# Altium footprint library ST封装.PcbLib: 1336 footprints (part 31 of 109) (continued)
## BGA150P31X31-961 [mm] "BGA, 961-Leads, Body 47.5x47.5mm, Pitch 1.5mm" (continued)
Top Overlay:
  circle w0.25: c-24.4,22.5 r0.125
  region: -22.75,23.75 -23.75,22.75 -23.75,23.75
  lines w0.2: -23.75,22.75 -22.75,23.75 ; -23.75,-23.75 23.75,-23.75 23.75,23.75 -23.75,23.75 -23.75,-23.75
Mechanical 13:
  lines w0.1: -23.75,-23.75 23.75,-23.75 23.75,23.75 -23.75,23.75 -23.75,-23.75
Mechanical 15:
  lines w0.1: -0.5,0 0.5,0 ; 0,-0.5 0,0.5 ; -24.75,-24.75 24.75,-24.75 24.75,24.75 -24.75,24.75 -24.75,-24.75
3D body: height 3.5, standoff 0, extent -23.75,-23.75 23.75,23.75

## BGA150P32X32-1024 [mm] "BGA, 1024-Leads, Body 50x50mm, Pitch 1.5mm"
height 3.5
pads (1024):
  round 0.6 smd: A1(-23.25,23.25) A2(-21.75,23.25) A3(-20.25,23.25) A4(-18.75,23.25) A5(-17.25,23.25) A6(-15.75,23.25) A7(-14.25,23.25) A8(-12.75,23.25) A9(-11.25,23.25) A10(-9.75,23.25) A11(-8.25,23.25) A12(-6.75,23.25) A13(-5.25,23.25) A14(-3.75,23.25) A15(-2.25,23.25) A16(-0.75,23.25) A17(0.75,23.25) A18(2.25,23.25) A19(3.75,23.25) A20(5.25,23.25) A21(6.75,23.25) A22(8.25,23.25) A23(9.75,23.25) A24(11.25,23.25) A25(12.75,23.25) A26(14.25,23.25) A27(15.75,23.25) A28(17.25,23.25) A29(18.75,23.25) A30(20.25,23.25) A31(21.75,23.25) A32(23.25,23.25) AA1(-23.25,-6.75) AA2(-21.75,-6.75) AA3(-20.25,-6.75) AA4(-18.75,-6.75) AA5(-17.25,-6.75) AA6(-15.75,-6.75) AA7(-14.25,-6.75) AA8(-12.75,-6.75) AA9(-11.25,-6.75) AA10(-9.75,-6.75) AA11(-8.25,-6.75) AA12(-6.75,-6.75) AA13(-5.25,-6.75) AA14(-3.75,-6.75) AA15(-2.25,-6.75) AA16(-0.75,-6.75) AA17(0.75,-6.75) AA18(2.25,-6.75) AA19(3.75,-6.75) AA20(5.25,-6.75) AA21(6.75,-6.75) AA22(8.25,-6.75) AA23(9.75,-6.75) AA24(11.25,-6.75) AA25(12.75,-6.75) AA26(14.25,-6.75) AA27(15.75,-6.75) AA28(17.25,-6.75) AA29(18.75,-6.75) AA30(20.25,-6.75) AA31(21.75,-6.75) AA32(23.25,-6.75) AB1(-23.25,-8.25) AB2(-21.75,-8.25) AB3(-20.25,-8.25) AB4(-18.75,-8.25) AB5(-17.25,-8.25) AB6(-15.75,-8.25) AB7(-14.25,-8.25) AB8(-12.75,-8.25) AB9(-11.25,-8.25) AB10(-9.75,-8.25) AB11(-8.25,-8.25) AB12(-6.75,-8.25) AB13(-5.25,-8.25) AB14(-3.75,-8.25) AB15(-2.25,-8.25) AB16(-0.75,-8.25) AB17(0.75,-8.25) AB18(2.25,-8.25) AB19(3.75,-8.25) AB20(5.25,-8.25) AB21(6.75,-8.25) AB22(8.25,-8.25) AB23(9.75,-8.25) AB24(11.25,-8.25) AB25(12.75,-8.25) AB26(14.25,-8.25) AB27(15.75,-8.25) AB28(17.25,-8.25) AB29(18.75,-8.25) AB30(20.25,-8.25) AB31(21.75,-8.25) AB32(23.25,-8.25) AC1(-23.25,-9.75) AC2(-21.75,-9.75) AC3(-20.25,-9.75) AC4(-18.75,-9.75) AC5(-17.25,-9.75) AC6(-15.75,-9.75) AC7(-14.25,-9.75) AC8(-12.75,-9.75) AC9(-11.25,-9.75) AC10(-9.75,-9.75) AC11(-8.25,-9.75) AC12(-6.75,-9.75) AC13(-5.25,-9.75) AC14(-3.75,-9.75) AC15(-2.25,-9.75) AC16(-0.75,-9.75) AC17(0.75,-9.75) AC18(2.25,-9.75) AC19(3.75,-9.75) AC20(5.25,-9.75) AC21(6.75,-9.75) AC22(8.25,-9.75) AC23(9.75,-9.75) AC24(11.25,-9.75) AC25(12.75,-9.75) AC26(14.25,-9.75) AC27(15.75,-9.75) AC28(17.25,-9.75) AC29(18.75,-9.75) AC30(20.25,-9.75) AC31(21.75,-9.75) AC32(23.25,-9.75) AD1(-23.25,-11.25) AD2(-21.75,-11.25) AD3(-20.25,-11.25) AD4(-18.75,-11.25) AD5(-17.25,-11.25) AD6(-15.75,-11.25) AD7(-14.25,-11.25) AD8(-12.75,-11.25) AD9(-11.25,-11.25) AD10(-9.75,-11.25) AD11(-8.25,-11.25) AD12(-6.75,-11.25) AD13(-5.25,-11.25) AD14(-3.75,-11.25) AD15(-2.25,-11.25) AD16(-0.75,-11.25) AD17(0.75,-11.25) AD18(2.25,-11.25) AD19(3.75,-11.25) AD20(5.25,-11.25) AD21(6.75,-11.25) AD22(8.25,-11.25) AD23(9.75,-11.25) AD24(11.25,-11.25) AD25(12.75,-11.25) AD26(14.25,-11.25) AD27(15.75,-11.25) AD28(17.25,-11.25) AD29(18.75,-11.25) AD30(20.25,-11.25) AD31(21.75,-11.25) AD32(23.25,-11.25) AE1(-23.25,-12.75) AE2(-21.75,-12.75) AE3(-20.25,-12.75) AE4(-18.75,-12.75) AE5(-17.25,-12.75) AE6(-15.75,-12.75) AE7(-14.25,-12.75) AE8(-12.75,-12.75) AE9(-11.25,-12.75) AE10(-9.75,-12.75) AE11(-8.25,-12.75) AE12(-6.75,-12.75) AE13(-5.25,-12.75) AE14(-3.75,-12.75) AE15(-2.25,-12.75) AE16(-0.75,-12.75) AE17(0.75,-12.75) AE18(2.25,-12.75) AE19(3.75,-12.75) AE20(5.25,-12.75) AE21(6.75,-12.75) AE22(8.25,-12.75) AE23(9.75,-12.75) AE24(11.25,-12.75) AE25(12.75,-12.75) AE26(14.25,-12.75) AE27(15.75,-12.75) AE28(17.25,-12.75) AE29(18.75,-12.75) AE30(20.25,-12.75) AE31(21.75,-12.75) AE32(23.25,-12.75) AF1(-23.25,-14.25) AF2(-21.75,-14.25) AF3(-20.25,-14.25) AF4(-18.75,-14.25) AF5(-17.25,-14.25) AF6(-15.75,-14.25) AF7(-14.25,-14.25) AF8(-12.75,-14.25) AF9(-11.25,-14.25) AF10(-9.75,-14.25) AF11(-8.25,-14.25) AF12(-6.75,-14.25) AF13(-5.25,-14.25) AF14(-3.75,-14.25) AF15(-2.25,-14.25) AF16(-0.75,-14.25) AF17(0.75,-14.25) AF18(2.25,-14.25) AF19(3.75,-14.25) AF20(5.25,-14.25) AF21(6.75,-14.25) AF22(8.25,-14.25) AF23(9.75,-14.25) AF24(11.25,-14.25) AF25(12.75,-14.25) AF26(14.25,-14.25) AF27(15.75,-14.25) AF28(17.25,-14.25) AF29(18.75,-14.25) AF30(20.25,-14.25) AF31(21.75,-14.25) AF32(23.25,-14.25) AG1(-23.25,-15.75) AG2(-21.75,-15.75) AG3(-20.25,-15.75) AG4(-18.75,-15.75) AG5(-17.25,-15.75) AG6(-15.75,-15.75) AG7(-14.25,-15.75) AG8(-12.75,-15.75) AG9(-11.25,-15.75) AG10(-9.75,-15.75) AG11(-8.25,-15.75) AG12(-6.75,-15.75) AG13(-5.25,-15.75) AG14(-3.75,-15.75) AG15(-2.25,-15.75) AG16(-0.75,-15.75) AG17(0.75,-15.75) AG18(2.25,-15.75) AG19(3.75,-15.75) AG20(5.25,-15.75) AG21(6.75,-15.75) AG22(8.25,-15.75) AG23(9.75,-15.75) AG24(11.25,-15.75) AG25(12.75,-15.75) AG26(14.25,-15.75) AG27(15.75,-15.75) AG28(17.25,-15.75) AG29(18.75,-15.75) AG30(20.25,-15.75) AG31(21.75,-15.75) AG32(23.25,-15.75) AH1(-23.25,-17.25) AH2(-21.75,-17.25) AH3(-20.25,-17.25) AH4(-18.75,-17.25) AH5(-17.25,-17.25) AH6(-15.75,-17.25) AH7(-14.25,-17.25) AH8(-12.75,-17.25) AH9(-11.25,-17.25) AH10(-9.75,-17.25) AH11(-8.25,-17.25) AH12(-6.75,-17.25) AH13(-5.25,-17.25) AH14(-3.75,-17.25) AH15(-2.25,-17.25) AH16(-0.75,-17.25) AH17(0.75,-17.25) AH18(2.25,-17.25) AH19(3.75,-17.25) AH20(5.25,-17.25) AH21(6.75,-17.25) AH22(8.25,-17.25) AH23(9.75,-17.25) AH24(11.25,-17.25) AH25(12.75,-17.25) AH26(14.25,-17.25) AH27(15.75,-17.25) AH28(17.25,-17.25) AH29(18.75,-17.25) AH30(20.25,-17.25) AH31(21.75,-17.25) AH32(23.25,-17.25) AJ1(-23.25,-18.75) AJ2(-21.75,-18.75) AJ3(-20.25,-18.75) AJ4(-18.75,-18.75) AJ5(-17.25,-18.75) AJ6(-15.75,-18.75) AJ7(-14.25,-18.75) AJ8(-12.75,-18.75) AJ9(-11.25,-18.75) AJ10(-9.75,-18.75) AJ11(-8.25,-18.75) AJ12(-6.75,-18.75) AJ13(-5.25,-18.75) AJ14(-3.75,-18.75) AJ15(-2.25,-18.75) AJ16(-0.75,-18.75) AJ17(0.75,-18.75) AJ18(2.25,-18.75) AJ19(3.75,-18.75) AJ20(5.25,-18.75) AJ21(6.75,-18.75) AJ22(8.25,-18.75) AJ23(9.75,-18.75) AJ24(11.25,-18.75) AJ25(12.75,-18.75) AJ26(14.25,-18.75) AJ27(15.75,-18.75) AJ28(17.25,-18.75) AJ29(18.75,-18.75) AJ30(20.25,-18.75) AJ31(21.75,-18.75) AJ32(23.25,-18.75) AK1(-23.25,-20.25) AK2(-21.75,-20.25) AK3(-20.25,-20.25) AK4(-18.75,-20.25) AK5(-17.25,-20.25) AK6(-15.75,-20.25) AK7(-14.25,-20.25) AK8(-12.75,-20.25) AK9(-11.25,-20.25) AK10(-9.75,-20.25) AK11(-8.25,-20.25) AK12(-6.75,-20.25) AK13(-5.25,-20.25) AK14(-3.75,-20.25) AK15(-2.25,-20.25) AK16(-0.75,-20.25) AK17(0.75,-20.25) AK18(2.25,-20.25) AK19(3.75,-20.25) AK20(5.25,-20.25) AK21(6.75,-20.25) AK22(8.25,-20.25) AK23(9.75,-20.25) AK24(11.25,-20.25) AK25(12.75,-20.25) AK26(14.25,-20.25) AK27(15.75,-20.25) AK28(17.25,-20.25) AK29(18.75,-20.25) AK30(20.25,-20.25) AK31(21.75,-20.25) AK32(23.25,-20.25) AL1(-23.25,-21.75) AL2(-21.75,-21.75) AL3(-20.25,-21.75) AL4(-18.75,-21.75) AL5(-17.25,-21.75) AL6(-15.75,-21.75) AL7(-14.25,-21.75) AL8(-12.75,-21.75) AL9(-11.25,-21.75) AL10(-9.75,-21.75) AL11(-8.25,-21.75) AL12(-6.75,-21.75) AL13(-5.25,-21.75) AL14(-3.75,-21.75) AL15(-2.25,-21.75) AL16(-0.75,-21.75) AL17(0.75,-21.75) AL18(2.25,-21.75) AL19(3.75,-21.75) AL20(5.25,-21.75) AL21(6.75,-21.75) AL22(8.25,-21.75) AL23(9.75,-21.75) AL24(11.25,-21.75) AL25(12.75,-21.75) AL26(14.25,-21.75) AL27(15.75,-21.75) AL28(17.25,-21.75) AL29(18.75,-21.75) AL30(20.25,-21.75) AL31(21.75,-21.75) AL32(23.25,-21.75) AM1(-23.25,-23.25) AM2(-21.75,-23.25) AM3(-20.25,-23.25) AM4(-18.75,-23.25) AM5(-17.25,-23.25) AM6(-15.75,-23.25) AM7(-14.25,-23.25) AM8(-12.75,-23.25) AM9(-11.25,-23.25) AM10(-9.75,-23.25) AM11(-8.25,-23.25) AM12(-6.75,-23.25) AM13(-5.25,-23.25) AM14(-3.75,-23.25) AM15(-2.25,-23.25) AM16(-0.75,-23.25) AM17(0.75,-23.25) AM18(2.25,-23.25) AM19(3.75,-23.25) AM20(5.25,-23.25) AM21(6.75,-23.25) AM22(8.25,-23.25) AM23(9.75,-23.25) AM24(11.25,-23.25) AM25(12.75,-23.25) AM26(14.25,-23.25) AM27(15.75,-23.25) AM28(17.25,-23.25) AM29(18.75,-23.25) AM30(20.25,-23.25) AM31(21.75,-23.25) AM32(23.25,-23.25) B1(-23.25,21.75) B2(-21.75,21.75) B3(-20.25,21.75) B4(-18.75,21.75) B5(-17.25,21.75) B6(-15.75,21.75) B7(-14.25,21.75) B8(-12.75,21.75) B9(-11.25,21.75) B10(-9.75,21.75) B11(-8.25,21.75) B12(-6.75,21.75) B13(-5.25,21.75) B14(-3.75,21.75) B15(-2.25,21.75) B16(-0.75,21.75) B17(0.75,21.75) B18(2.25,21.75) B19(3.75,21.75) B20(5.25,21.75) B21(6.75,21.75) B22(8.25,21.75) B23(9.75,21.75) B24(11.25,21.75) B25(12.75,21.75) B26(14.25,21.75) B27(15.75,21.75) B28(17.25,21.75) B29(18.75,21.75) B30(20.25,21.75) B31(21.75,21.75) B32(23.25,21.75) C1(-23.25,20.25) C2(-21.75,20.25) C3(-20.25,20.25) C4(-18.75,20.25) C5(-17.25,20.25) C6(-15.75,20.25) C7(-14.25,20.25) C8(-12.75,20.25) C9(-11.25,20.25) C10(-9.75,20.25) C11(-8.25,20.25) C12(-6.75,20.25) C13(-5.25,20.25) C14(-3.75,20.25) C15(-2.25,20.25) C16(-0.75,20.25) C17(0.75,20.25) C18(2.25,20.25) C19(3.75,20.25) C20(5.25,20.25) C21(6.75,20.25) C22(8.25,20.25) C23(9.75,20.25) C24(11.25,20.25) C25(12.75,20.25) C26(14.25,20.25) C27(15.75,20.25) C28(17.25,20.25) C29(18.75,20.25) C30(20.25,20.25) C31(21.75,20.25) C32(23.25,20.25) D1(-23.25,18.75) D2(-21.75,18.75) D3(-20.25,18.75) D4(-18.75,18.75) D5(-17.25,18.75) D6(-15.75,18.75) D7(-14.25,18.75) D8(-12.75,18.75) D9(-11.25,18.75) D10(-9.75,18.75) D11(-8.25,18.75) D12(-6.75,18.75) D13(-5.25,18.75) D14(-3.75,18.75) D15(-2.25,18.75) D16(-0.75,18.75) D17(0.75,18.75) D18(2.25,18.75) D19(3.75,18.75) D20(5.25,18.75) D21(6.75,18.75) D22(8.25,18.75) D23(9.75,18.75) D24(11.25,18.75) D25(12.75,18.75) D26(14.25,18.75) D27(15.75,18.75) D28(17.25,18.75) D29(18.75,18.75) D30(20.25,18.75) D31(21.75,18.75) D32(23.25,18.75) E1(-23.25,17.25) E2(-21.75,17.25) E3(-20.25,17.25) E4(-18.75,17.25) E5(-17.25,17.25) E6(-15.75,17.25) E7(-14.25,17.25) E8(-12.75,17.25) E9(-11.25,17.25) E10(-9.75,17.25) E11(-8.25,17.25) E12(-6.75,17.25) E13(-5.25,17.25) E14(-3.75,17.25) E15(-2.25,17.25) E16(-0.75,17.25) E17(0.75,17.25) E18(2.25,17.25) E19(3.75,17.25) E20(5.25,17.25) E21(6.75,17.25) E22(8.25,17.25) E23(9.75,17.25) E24(11.25,17.25) E25(12.75,17.25) E26(14.25,17.25) E27(15.75,17.25) E28(17.25,17.25) E29(18.75,17.25) E30(20.25,17.25) E31(21.75,17.25) E32(23.25,17.25) F1(-23.25,15.75) F2(-21.75,15.75) F3(-20.25,15.75) F4(-18.75,15.75) F5(-17.25,15.75) F6(-15.75,15.75) F7(-14.25,15.75) F8(-12.75,15.75) F9(-11.25,15.75) F10(-9.75,15.75) F11(-8.25,15.75) F12(-6.75,15.75) F13(-5.25,15.75) F14(-3.75,15.75) F15(-2.25,15.75) F16(-0.75,15.75) F17(0.75,15.75) F18(2.25,15.75) F19(3.75,15.75) F20(5.25,15.75) F21(6.75,15.75) F22(8.25,15.75) F23(9.75,15.75) F24(11.25,15.75) F25(12.75,15.75) F26(14.25,15.75) F27(15.75,15.75) F28(17.25,15.75) F29(18.75,15.75) F30(20.25,15.75) F31(21.75,15.75) F32(23.25,15.75) G1(-23.25,14.25) G2(-21.75,14.25) G3(-20.25,14.25) G4(-18.75,14.25) G5(-17.25,14.25) G6(-15.75,14.25) G7(-14.25,14.25) G8(-12.75,14.25) G9(-11.25,14.25) G10(-9.75,14.25) G11(-8.25,14.25) G12(-6.75,14.25) G13(-5.25,14.25) G14(-3.75,14.25) G15(-2.25,14.25) G16(-0.75,14.25) G17(0.75,14.25) G18(2.25,14.25) G19(3.75,14.25) G20(5.25,14.25) G21(6.75,14.25) G22(8.25,14.25) G23(9.75,14.25) G24(11.25,14.25) G25(12.75,14.25) G26(14.25,14.25) G27(15.75,14.25) G28(17.25,14.25) G29(18.75,14.25) G30(20.25,14.25) G31(21.75,14.25) G32(23.25,14.25) H1(-23.25,12.75) H2(-21.75,12.75) H3(-20.25,12.75) H4(-18.75,12.75) H5(-17.25,12.75) H6(-15.75,12.75) H7(-14.25,12.75) H8(-12.75,12.75) H9(-11.25,12.75) H10(-9.75,12.75) H11(-8.25,12.75) H12(-6.75,12.75) H13(-5.25,12.75) H14(-3.75,12.75) H15(-2.25,12.75) H16(-0.75,12.75) H17(0.75,12.75) H18(2.25,12.75) H19(3.75,12.75) H20(5.25,12.75) H21(6.75,12.75) H22(8.25,12.75) H23(9.75,12.75) H24(11.25,12.75) H25(12.75,12.75) H26(14.25,12.75) H27(15.75,12.75) H28(17.25,12.75) H29(18.75,12.75) H30(20.25,12.75) H31(21.75,12.75) H32(23.25,12.75) J1(-23.25,11.25) J2(-21.75,11.25) J3(-20.25,11.25) J4(-18.75,11.25) J5(-17.25,11.25) J6(-15.75,11.25) J7(-14.25,11.25) J8(-12.75,11.25) J9(-11.25,11.25) J10(-9.75,11.25) J11(-8.25,11.25) J12(-6.75,11.25) J13(-5.25,11.25) J14(-3.75,11.25) J15(-2.25,11.25) J16(-0.75,11.25) J17(0.75,11.25) J18(2.25,11.25) J19(3.75,11.25) J20(5.25,11.25) J21(6.75,11.25) J22(8.25,11.25) J23(9.75,11.25) J24(11.25,11.25) J25(12.75,11.25) J26(14.25,11.25) J27(15.75,11.25) J28(17.25,11.25) J29(18.75,11.25) J30(20.25,11.25) J31(21.75,11.25) J32(23.25,11.25) K1(-23.25,9.75) K2(-21.75,9.75) K3(-20.25,9.75) K4(-18.75,9.75) K5(-17.25,9.75) K6(-15.75,9.75) K7(-14.25,9.75) K8(-12.75,9.75) K9(-11.25,9.75) K10(-9.75,9.75) K11(-8.25,9.75) K12(-6.75,9.75) K13(-5.25,9.75) K14(-3.75,9.75) K15(-2.25,9.75) K16(-0.75,9.75) K17(0.75,9.75) K18(2.25,9.75) K19(3.75,9.75) K20(5.25,9.75) K21(6.75,9.75) K22(8.25,9.75) K23(9.75,9.75) K24(11.25,9.75) K25(12.75,9.75) K26(14.25,9.75) K27(15.75,9.75) K28(17.25,9.75) K29(18.75,9.75) K30(20.25,9.75) K31(21.75,9.75) K32(23.25,9.75) L1(-23.25,8.25) L2(-21.75,8.25) L3(-20.25,8.25) L4(-18.75,8.25) L5(-17.25,8.25) L6(-15.75,8.25) L7(-14.25,8.25) L8(-12.75,8.25) L9(-11.25,8.25) L10(-9.75,8.25) L11(-8.25,8.25) L12(-6.75,8.25) L13(-5.25,8.25) L14(-3.75,8.25) L15(-2.25,8.25) L16(-0.75,8.25) L17(0.75,8.25) L18(2.25,8.25) L19(3.75,8.25) L20(5.25,8.25) L21(6.75,8.25) L22(8.25,8.25) L23(9.75,8.25) L24(11.25,8.25) L25(12.75,8.25) L26(14.25,8.25) L27(15.75,8.25) L28(17.25,8.25) L29(18.75,8.25) L30(20.25,8.25) L31(21.75,8.25) L32(23.25,8.25) M1(-23.25,6.75) M2(-21.75,6.75) M3(-20.25,6.75) M4(-18.75,6.75) M5(-17.25,6.75) M6(-15.75,6.75) M7(-14.25,6.75) M8(-12.75,6.75) M9(-11.25,6.75) M10(-9.75,6.75) M11(-8.25,6.75) M12(-6.75,6.75) M13(-5.25,6.75) M14(-3.75,6.75) M15(-2.25,6.75) M16(-0.75,6.75) M17(0.75,6.75) M18(2.25,6.75) M19(3.75,6.75) M20(5.25,6.75) M21(6.75,6.75) M22(8.25,6.75) M23(9.75,6.75) M24(11.25,6.75) M25(12.75,6.75) M26(14.25,6.75) M27(15.75,6.75) M28(17.25,6.75) M29(18.75,6.75) M30(20.25,6.75) M31(21.75,6.75) M32(23.25,6.75) N1(-23.25,5.25) N2(-21.75,5.25) N3(-20.25,5.25) N4(-18.75,5.25) N5(-17.25,5.25) N6(-15.75,5.25) N7(-14.25,5.25) N8(-12.75,5.25) N9(-11.25,5.25) N10(-9.75,5.25) N11(-8.25,5.25) N12(-6.75,5.25) N13(-5.25,5.25) N14(-3.75,5.25) N15(-2.25,5.25) N16(-0.75,5.25) N17(0.75,5.25) N18(2.25,5.25) N19(3.75,5.25) N20(5.25,5.25) N21(6.75,5.25) N22(8.25,5.25) N23(9.75,5.25) N24(11.25,5.25) N25(12.75,5.25) N26(14.25,5.25) N27(15.75,5.25) N28(17.25,5.25) N29(18.75,5.25) N30(20.25,5.25) N31(21.75,5.25) N32(23.25,5.25) P1(-23.25,3.75) P2(-21.75,3.75) P3(-20.25,3.75) P4(-18.75,3.75) P5(-17.25,3.75) P6(-15.75,3.75) P7(-14.25,3.75) P8(-12.75,3.75) P9(-11.25,3.75) P10(-9.75,3.75) P11(-8.25,3.75) P12(-6.75,3.75) P13(-5.25,3.75) P14(-3.75,3.75) P15(-2.25,3.75) P16(-0.75,3.75) P17(0.75,3.75) P18(2.25,3.75) P19(3.75,3.75) P20(5.25,3.75) P21(6.75,3.75) P22(8.25,3.75) P23(9.75,3.75) P24(11.25,3.75) P25(12.75,3.75) P26(14.25,3.75) P27(15.75,3.75) P28(17.25,3.75) P29(18.75,3.75) P30(20.25,3.75) P31(21.75,3.75) P32(23.25,3.75) R1(-23.25,2.25) R2(-21.75,2.25) R3(-20.25,2.25) R4(-18.75,2.25) R5(-17.25,2.25) R6(-15.75,2.25) R7(-14.25,2.25) R8(-12.75,2.25) R9(-11.25,2.25) R10(-9.75,2.25) R11(-8.25,2.25) R12(-6.75,2.25) R13(-5.25,2.25) R14(-3.75,2.25) R15(-2.25,2.25) R16(-0.75,2.25) R17(0.75,2.25) R18(2.25,2.25) R19(3.75,2.25) R20(5.25,2.25) R21(6.75,2.25) R22(8.25,2.25) R23(9.75,2.25) R24(11.25,2.25) R25(12.75,2.25) R26(14.25,2.25) R27(15.75,2.25) R28(17.25,2.25) R29(18.75,2.25) R30(20.25,2.25) R31(21.75,2.25) R32(23.25,2.25) T1(-23.25,0.75) T2(-21.75,0.75) T3(-20.25,0.75) T4(-18.75,0.75) T5(-17.25,0.75) T6(-15.75,0.75) T7(-14.25,0.75) T8(-12.75,0.75) T9(-11.25,0.75) T10(-9.75,0.75) T11(-8.25,0.75) T12(-6.75,0.75) T13(-5.25,0.75) T14(-3.75,0.75) T15(-2.25,0.75) T16(-0.75,0.75) T17(0.75,0.75) T18(2.25,0.75) T19(3.75,0.75) T20(5.25,0.75) T21(6.75,0.75) T22(8.25,0.75) T23(9.75,0.75) T24(11.25,0.75) T25(12.75,0.75) T26(14.25,0.75) T27(15.75,0.75) T28(17.25,0.75) T29(18.75,0.75) T30(20.25,0.75) T31(21.75,0.75) T32(23.25,0.75) U1(-23.25,-0.75) U2(-21.75,-0.75) U3(-20.25,-0.75) U4(-18.75,-0.75) U5(-17.25,-0.75) U6(-15.75,-0.75) U7(-14.25,-0.75) U8(-12.75,-0.75) U9(-11.25,-0.75) U10(-9.75,-0.75) U11(-8.25,-0.75) U12(-6.75,-0.75) U13(-5.25,-0.75) U14(-3.75,-0.75) U15(-2.25,-0.75) U16(-0.75,-0.75) U17(0.75,-0.75) U18(2.25,-0.75) U19(3.75,-0.75) U20(5.25,-0.75) U21(6.75,-0.75) U22(8.25,-0.75) U23(9.75,-0.75) U24(11.25,-0.75) U25(12.75,-0.75) U26(14.25,-0.75) U27(15.75,-0.75) U28(17.25,-0.75) U29(18.75,-0.75) U30(20.25,-0.75) U31(21.75,-0.75) U32(23.25,-0.75) V1(-23.25,-2.25) V2(-21.75,-2.25) V3(-20.25,-2.25) V4(-18.75,-2.25) V5(-17.25,-2.25) V6(-15.75,-2.25) V7(-14.25,-2.25) V8(-12.75,-2.25) V9(-11.25,-2.25) V10(-9.75,-2.25) V11(-8.25,-2.25) V12(-6.75,-2.25) V13(-5.25,-2.25) V14(-3.75,-2.25) V15(-2.25,-2.25) V16(-0.75,-2.25) V17(0.75,-2.25) V18(2.25,-2.25) V19(3.75,-2.25) V20(5.25,-2.25) V21(6.75,-2.25) V22(8.25,-2.25) V23(9.75,-2.25) V24(11.25,-2.25) V25(12.75,-2.25) V26(14.25,-2.25) V27(15.75,-2.25) V28(17.25,-2.25) V29(18.75,-2.25) V30(20.25,-2.25) V31(21.75,-2.25) V32(23.25,-2.25) W1(-23.25,-3.75) W2(-21.75,-3.75) W3(-20.25,-3.75) W4(-18.75,-3.75) W5(-17.25,-3.75) W6(-15.75,-3.75) W7(-14.25,-3.75) W8(-12.75,-3.75) W9(-11.25,-3.75) W10(-9.75,-3.75) W11(-8.25,-3.75) W12(-6.75,-3.75) W13(-5.25,-3.75) W14(-3.75,-3.75) W15(-2.25,-3.75) W16(-0.75,-3.75) W17(0.75,-3.75) W18(2.25,-3.75) W19(3.75,-3.75) W20(5.25,-3.75) W21(6.75,-3.75) W22(8.25,-3.75) W23(9.75,-3.75) W24(11.25,-3.75) W25(12.75,-3.75) W26(14.25,-3.75) W27(15.75,-3.75) W28(17.25,-3.75) W29(18.75,-3.75) W30(20.25,-3.75) W31(21.75,-3.75) W32(23.25,-3.75) Y1(-23.25,-5.25) Y2(-21.75,-5.25) Y3(-20.25,-5.25) Y4(-18.75,-5.25) Y5(-17.25,-5.25) Y6(-15.75,-5.25) Y7(-14.25,-5.25) Y8(-12.75,-5.25) Y9(-11.25,-5.25) Y10(-9.75,-5.25) Y11(-8.25,-5.25) Y12(-6.75,-5.25) Y13(-5.25,-5.25) Y14(-3.75,-5.25) Y15(-2.25,-5.25) Y16(-0.75,-5.25) Y17(0.75,-5.25) Y18(2.25,-5.25) Y19(3.75,-5.25) Y20(5.25,-5.25) Y21(6.75,-5.25) Y22(8.25,-5.25) Y23(9.75,-5.25) Y24(11.25,-5.25) Y25(12.75,-5.25) Y26(14.25,-5.25) Y27(15.75,-5.25) Y28(17.25,-5.25) Y29(18.75,-5.25) Y30(20.25,-5.25) Y31(21.75,-5.25) Y32(23.25,-5.25)
Top Overlay:
  circle w0.25: c-25.65,23.25 r0.125
  region: -24,25 -25,24 -25,25
  lines w0.2: -25,24 -24,25 ; -25,-25 25,-25 25,25 -25,25 -25,-25
Mechanical 13:
  lines w0.1: -25,-25 25,-25 25,25 -25,25 -25,-25
Mechanical 15:
  lines w0.1: -0.5,0 0.5,0 ; 0,-0.5 0,0.5 ; -26,-26 26,-26 26,26 -26,26 -26,-26
3D body: height 3.5, standoff 0, extent -25,-25 25,25